# Altium footprint library CUSTOM PCB.PcbLib: 404 footprints (part 7 of 26)
Each footprint in its own frame and in the unit in brackets; x right, y up, seen from the top. Pads: shape width x height; smd on the part's side, far side on the other; paste and mask are expansions set on the pad; w line width, h text height; cw(c..) or ccw(c..) is an arc to the next point about the centre after c.
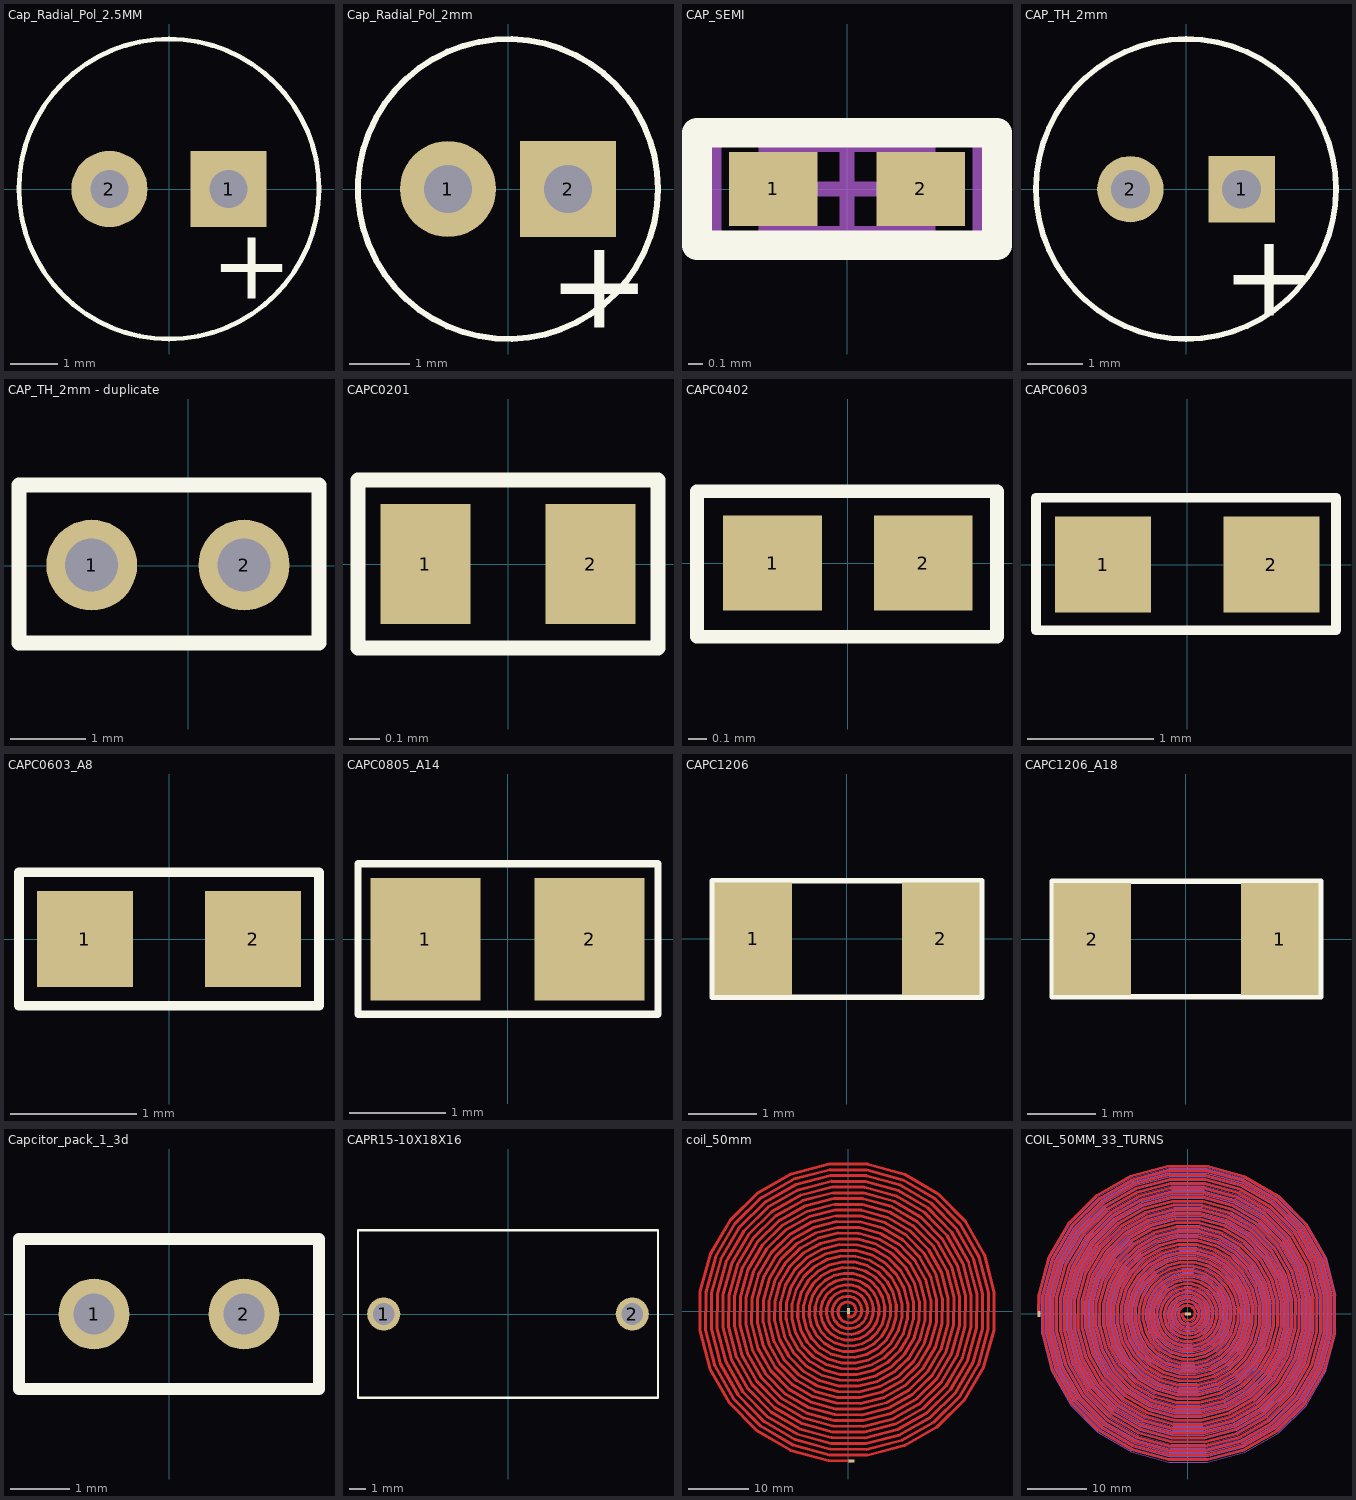
[diagram p6: the footprints below, top view; thin cyan lines are the x and y axes]

## Cap_Radial_Pol_2.5MM [mm]
pads (2):
  rect 1.6x1.6 hole 0.8: 1(1.25,0)
  round 1.6 hole 0.8: 2(-1.25,0)
Top Overlay:
  circle w0.1: c0,0 r3.15
  text "+" at 0.872,-2.307 h1.5
3D body "CapAluRadial_D63H112P25.step": height 11.2, standoff -3, extent -3.184,-3.116 3.117,3.184

## Cap_Radial_Pol_2mm [mm]
pads (2):
  round 1.6 hole 0.8: 1(-1,0)
  rect 1.6x1.6 hole 0.8: 2(1,0)
Top Overlay:
  circle w0.1: c0,0 r2.5
  text "+" at 0.66,-2.311 h1.5
3D body "PCAP_5x11.step": height 11.04, standoff -4.67, extent -2.507,-2.499 2.507,2.499

## CAP_SEMI [mm] "0402_PACK"
pads (2):
  rect 0.6x0.5 smd: 1(-0.5,0) 2(0.5,0)
Top Overlay:
  lines w0.2: -1.016,-0.381 1.016,-0.381 1.016,0.381 -1.016,0.381 -1.016,-0.381
Mechanical 13:
  lines w0.1: -0.55,-0.3 0.55,-0.3 0.55,0.3 -0.55,0.3 -0.55,-0.3
Mechanical 15:
  lines w0.1: -0.3,0 0.3,0 ; 0,-0.3 0,0.3 ; -0.9,-0.35 0.9,-0.35 0.9,0.35 -0.9,0.35 -0.9,-0.35
3D body "SW3dPS-0402 SMD Capacitor.STEP": height 0.12, standoff -0.08, extent -0.5,-0.3 0.5,0.3

## CAP_TH_2mm [mm]
pads (2):
  rect 1.2x1.2 hole 0.7: 1(1.006,0)
  round 1.2 hole 0.7: 2(-1.006,0)
Top Overlay:
  circle w0.1: c0,0.003 r2.713
  text "+" at 0.65,-2.293 h1.5
3D body "User Library-Aluminum Electrolytic Capacitors.STEP": height 13, standoff -0.78, extent -2.709,-2.744 2.792,2.758

## CAP_TH_2mm - duplicate [mm]
pads (2):
  round 1.2 hole 0.7: 1(-1.275,0.01) 2(0.737,0.01)
Top Overlay:
  lines w0.2: -2.235,-1.016 1.727,-1.016 1.727,1.067 -2.235,1.067 -2.235,-1.016
3D body "User Library-Aluminum Electrolytic Capacitors.STEP": height 13, standoff -0.78, extent -2.979,-2.733 2.522,2.769

## CAPC0201 [mm]
pads (2):
  rect 0.3x0.4 smd: 1(-0.275,0) 2(0.275,0)
Top Overlay:
  lines w0.051: -0.5,-0.28 -0.5,0.28 0.5,0.28 0.5,-0.28 -0.5,-0.28
3D body "44025.stp": height 0.15, standoff -0.15, extent -0.3,-0.15 0.3,0.15

## CAPC0402 [mm]
pads (2):
  rect 0.55x0.53 smd: 1(-0.419,0) 2(0.419,0)
Top Overlay:
  lines w0.076: -0.84,-0.41 -0.84,0.4 0.83,0.4 0.83,-0.41 -0.84,-0.41
3D body "User Library-0402 SMD Capacitor.x_t": height 0.2, standoff 0, extent -0.5,-0.3 0.5,0.3

## CAPC0603 [mil]
pads (2):
  rect 30x30 smd: 1(-26.26,0) 2(26.26,0)
Top Overlay:
  lines w3: -47.24,-20.47 46.46,-20.47 46.46,20.87 -47.24,20.87 -47.24,-20.47
3D body "0603 SMD Capacitor.x_t": height 9.13, standoff -2.76, extent -31.5,-15.75 31.5,15.75

## CAPC0603_A8 [mil]
pads (2):
  rect 30x30 smd: 1(-26.26,0) 2(26.26,0)
Top Overlay:
  lines w2.99: -46.85,-20.87 46.85,-20.87 46.85,20.87 -46.85,20.87 -46.85,-20.87
3D body "0603 SMD Capacitor.x_t": height 9.13, standoff -2.76, extent -31.5,-15.75 31.5,15.74

## CAPC0805_A14 [mm]
pads (2):
  rect 1.14x1.27 smd: 1(-0.852,0) 2(0.852,0)
Top Overlay:
  lines w0.076: -1.55,-0.778 -1.55,0.783 1.56,0.783 1.56,-0.778 -1.55,-0.778
3D body "CAPC0805.STEP": height 0.82, standoff -0.08, extent -1.301,-0.678 1.301,0.678
3D body "CAPC0805.STEP": height 0.9, standoff 0, extent -1.301,-0.678 1.301,0.678

## CAPC1206 [mm]
pads (2):
  rect 1.14x1.65 smd: 1(-1.38,0) 2(1.38,0)
Top Overlay:
  lines w0.076: -1.98,-0.86 1.98,-0.86 1.98,0.85 -1.98,0.85 -1.98,-0.86
3D body "User Library-1206 SMD Capacitor.x_t": height 1, standoff 0, extent -1.6,-0.8 1.6,0.8

## CAPC1206_A18 [mm]
pads (2):
  rect 1.14x1.65 smd: 1(1.38,0) 2(-1.38,0)
Top Overlay:
  lines w0.076: -1.97,-0.85 1.98,-0.85 1.98,0.85 -1.97,0.85 -1.97,-0.85
3D body "User Library-1206 SMD Capacitor.x_t": height 1, standoff 0, extent -1.6,-0.8 1.6,0.8

## Capcitor_pack_1_3d [mm]
pads (2):
  round 1.2 hole 0.7: 1(-1.27,0) 2(1.27,0)
Top Overlay:
  lines w0.2: -2.54,-1.27 -2.54,1.27 2.54,1.27 2.54,-1.27 -2.54,-1.27
3D body "Capacitor eletrolitico 100uFx35.STEP": height 11.61, standoff -2.39, extent -2.555,-2.56 2.555,2.54

## CAPR15-10X18X16 [mm]
pads (2):
  round 2 hole 1.3: 1(-7.5,0) 2(7.5,0)
Top Overlay:
  lines w0.15: -9.05,-5.05 -9.05,5.05 9.05,5.05 9.05,-5.05 -9.05,-5.05
Mechanical 15:
  text "1" at -7.5,-0.254 h0.64
  text "2" at 7.5,-0.254 h0.64

## coil_50mm [mm]
pads (2):
  rect 1x0.5 smd: 1(0.508,-24.79)
  rect 0.5x1 smd: 2(0,0)
Top Layer:
  lines w0.5: 0,0 0,-0.488 0,-0.976 0.133,-1.016 0.405,-0.984 0.669,-0.877 0.904,-0.699 1.089,-0.457 1.209,-0.164 1.248,0.159 1.2,0.492 1.062,0.81 0.84,1.089 0.543,1.306 0.19,1.441 -0.196,1.481 -0.589,1.416 -0.961,1.247 -1.284,0.98 -1.533,0.629 -1.684,0.216 -1.724,-0.232 -1.643,-0.686 -1.443,-1.112 -1.131,-1.48 -0.727,-1.759 -0.253,-1.927 0.258,-1.967 0.772,-1.87 1.253,-1.638 1.665,-1.283 1.976,-0.824 2.16,-0.29 2.199,0.284 2.086,0.859 1.823,1.394 1.423,1.85 0.91,2.192 0.316,2.392 -0.321,2.432 -0.956,2.303 -1.545,2.008 -2.045,1.564 -2.419,0.997 -2.635,0.342 -2.675,-0.358 -2.529,-1.053 -2.204,-1.696 -1.715,-2.241 -1.094,-2.646 -0.378,-2.878 0.383,-2.918 1.14,-2.756 1.837,-2.399 2.426,-1.867 2.862,-1.191 3.111,-0.415 3.15,0.409 2.973,1.226 2.584,1.978 2.007,2.611 1.277,3.078 0.441,3.343 -0.446,3.383 -1.323,3.189 -2.129,2.769 -2.806,2.148 -3.305,1.364 -3.586,0.467 -3.626,-0.483 -3.416,-1.42 -2.965,-2.28 -2.299,-3.002 -1.461,-3.532 -0.503,-3.829 0.509,-3.869 1.507,-3.643 2.421,-3.16 3.187,-2.451 3.748,-1.558 4.062,-0.54 4.101,0.535 3.859,1.593 3.345,2.562 2.591,3.372 1.644,3.964 0.566,4.294 -0.571,4.334 -1.69,4.075 -2.713,3.53 -3.567,2.732 -4.191,1.731 -4.537,0.592 -4.577,-0.608 -4.302,-1.787 -3.726,-2.864 -2.883,-3.763 -1.828,-4.418 -0.629,-4.78 0.634,-4.82 1.874,-4.529 3.005,-3.921 3.948,-3.035 4.634,-1.925 5.013,-0.665 5.052,0.66 4.745,1.96 4.106,3.145 3.175,4.133 2.011,4.85 0.691,5.245 -0.696,5.285 -2.057,4.961 -3.297,4.291 -4.328,3.316 -5.077,2.098 -5.488,0.717 -5.528,-0.733 -5.188,-2.154 -4.487,-3.448 -3.467,-4.524 -2.195,-5.304 -0.754,-5.731 0.759,-5.771 2.241,-5.415 3.589,-4.682 4.709,-3.618 5.52,-2.292 5.964,-0.79 6.003,0.785 5.631,2.327 4.867,3.729 3.759,4.894 2.378,5.736 0.816,6.196 -0.822,6.236 -2.424,5.847 -3.881,5.052 -5.089,3.9 -5.963,2.465 -6.439,0.842 -6.479,-0.858 -6.074,-2.521 -5.248,-4.032 -4.051,-5.285 -2.562,-6.19 -0.879,-6.682 0.884,-6.722 2.608,-6.301 4.173,-5.443 5.47,-4.202 6.406,-2.659 6.915,-0.916 6.954,0.91 6.517,2.694 5.628,4.313 4.343,5.655 2.745,6.623 0.942,7.147 -0.947,7.187 -2.791,6.733 -4.465,5.813 -5.85,4.484 -6.85,2.832 -7.39,0.968 -7.43,-0.983 -6.96,-2.888 -6.009,-4.616 -4.635,-6.046 -2.929,-7.076 -1.004,-7.633 1.009,-7.673 2.975,-7.187 4.757,-6.204 6.231,-4.786 7.293,-3.026 7.866,-1.041 7.905,1.035 7.403,3.061 6.389,4.897 4.927,6.416 3.112,7.509 1.067,8.098 -1.072,8.138 -3.158,7.62 -5.049,6.574 -6.611,5.068 -7.736,3.199 -8.341,1.093 -8.381,-1.109 -7.847,-3.255 -6.77,-5.2 -5.219,-6.807 -3.296,-7.963 -1.129,-8.584 1.135,-8.624 3.342,-8.073 5.341,-6.965 6.992,-5.37 8.179,-3.393 8.817,-1.166 8.856,1.161 8.29,3.428 7.15,5.481 5.511,7.176 3.48,8.395 1.192,9.049 -1.197,9.089 -3.525,8.506 -5.632,7.335 -7.372,5.651 -8.622,3.566 -9.292,1.218 -9.332,-1.234 -8.733,-3.623 -7.531,-5.784 -5.803,-7.568 -3.663,-8.849 -1.255,-9.535 1.26,-9.575 3.709,-8.96 5.924,-7.726 7.753,-5.954 9.065,-3.76 9.768,-1.291 9.807,1.286 9.176,3.795 7.911,6.065 6.095,7.937 3.847,9.281 1.317,10 -1.322,10.04 -3.892,9.392 -6.216,8.096 -8.133,6.235 -9.508,3.933 -10.243,1.343 -10.283,-1.359 -9.619,-3.99 -8.292,-6.368 -6.387,-8.329 -4.03,-9.735 -1.38,-10.486 1.385,-10.526 4.076,-9.846 6.508,-8.487 8.514,-6.538 9.951,-4.127 10.719,-1.416 10.758,1.411 10.062,4.162 8.672,6.649 6.679,8.698 4.214,10.167 1.442,10.951 -1.448,10.991 -4.26,10.278 -6.8,8.857 -8.894,6.819 -10.394,4.3 -11.194,1.468 -11.234,-1.484 -10.505,-4.357 -9.053,-6.952 -6.971,-9.09 -4.397,-10.621 -1.505,-11.437 1.51,-11.477 4.443,-10.732 7.092,-9.248 9.275,-7.122 10.837,-4.494 11.67,-1.542 11.709,1.536 10.948,4.529 9.433,7.233 7.263,9.459 4.581,11.054 1.568,11.902 -1.573,11.942 -4.627,11.164 -7.384,9.618 -9.655,7.403 -11.28,4.667 -12.145,1.594 -12.185,-1.609 -11.391,-4.724 -9.814,-7.536 -7.555,-9.851 -4.764,-11.507 -1.63,-12.388 1.635,-12.428 4.81,-11.618 7.676,-10.009 10.035,-7.706 11.723,-4.861 12.62,-1.667 12.66,1.661 11.834,4.897 10.194,7.817 7.846,10.22 4.948,11.94 1.693,12.853 -1.698,12.892 -4.994,12.05 -7.968,10.379 -10.416,7.987 -12.167,5.034 -13.096,1.719 -13.136,-1.735 -12.277,-5.091 -10.575,-8.119 -8.138,-10.612 -5.131,-12.393 -1.755,-13.339 1.761,-13.379 5.177,-12.504 8.26,-10.77 10.796,-8.29 12.61,-5.228 13.571,-1.792 13.611,1.787 12.72,5.264 10.955,8.401 8.43,10.981 5.315,12.826 1.818,13.804 -1.823,13.843 -5.361,12.937 -8.552,11.14 -11.177,8.571 -13.053,5.401 -14.047,1.844 -14.087,-1.86 -13.164,-5.458 -11.335,-8.703 -8.722,-11.373 -5.498,-13.28 -1.881,-14.29 1.886,-14.33 5.544,-13.39 8.844,-11.531 11.557,-8.874 13.496,-5.596 14.522,-1.917 14.562,1.912 13.607,5.631 11.716,8.985 9.014,11.742 5.682,13.712 1.943,14.755 -1.948,14.794 -5.728,13.823 -9.136,11.901 -11.938,9.155 -13.939,5.768 -14.998,1.969 -15.038,-1.985 -14.05,-5.825 -12.096,-9.287 -9.306,-12.134 -5.865,-14.166 -2.006,-15.241 2.011,-15.281 5.911,-14.277 9.428,-12.292 12.318,-9.458 14.382,-5.963 15.473,-2.042 15.513,2.037 14.493,5.998 12.477,9.569 9.598,12.503 6.049,14.598 2.068,15.706 -2.074,15.745 -6.095,14.709 -9.72,12.662 -12.699,9.739 -14.825,6.135 -15.949,2.094 -15.989,-2.11 -14.936,-6.192 -12.857,-9.871 -9.89,-12.894 -6.233,-15.052 -2.131,-16.192 2.136,-16.232 6.278,-15.163 10.012,-13.053 13.079,-10.042 15.268,-6.33 16.424,-2.168 16.464,2.162 15.379,6.365 13.238,10.152 10.182,13.264 6.416,15.484 2.194,16.657 -2.199,16.696 -6.462,15.595 -10.304,13.423 -13.46,10.323 -15.711,6.502 -16.9,2.22 -16.939,-2.235 -15.822,-6.559 -13.618,-10.455 -10.474,-13.655 -6.6,-15.938 -2.256,-17.143 2.261,-17.183 6.645,-16.049 10.596,-13.814 13.84,-10.625 16.154,-6.697 17.375,-2.293 17.415,2.287 16.265,6.732 13.999,10.736 10.766,14.025 6.783,16.371 2.319,17.608 -2.324,17.647 -6.829,16.481 -10.888,14.184 -14.221,10.907 -16.597,6.87 -17.851,2.345 -17.89,-2.361 -16.708,-6.926 -14.379,-11.039 -11.058,-14.416 -6.967,-16.824 -2.381,-18.094 2.387,-18.134 7.013,-16.935 11.18,-14.575 14.601,-11.209 17.041,-7.064 18.326,-2.418 18.366,2.413 17.151,7.099 14.76,11.32 11.35,14.786 7.15,17.257 2.444,18.559 -2.449,18.598 -7.196,17.367 -11.472,14.945 -14.982,11.491 -17.484,7.237 -18.802,2.47 -18.841,-2.486 -17.594,-7.293 -15.14,-11.623 -11.642,-15.177 -7.334,-17.71 -2.507,-19.045 2.512,-19.085 7.38,-17.821 11.764,-15.336 15.362,-11.793 17.927,-7.431 19.277,-2.543 19.317,2.538 18.037,7.466 15.521,11.904 11.934,15.547 7.517,18.143 2.569,19.51 -2.574,19.549 -7.563,18.254 -12.056,15.706 -15.743,12.074 -18.37,7.604 -19.753,2.595 -19.792,-2.611 -18.481,-7.66 -15.901,-12.207 -12.226,-15.938 -7.701,-18.597 -2.632,-19.996 2.637,-20.036 7.747,-18.707 12.347,-16.097 16.123,-12.377 18.813,-7.798 20.228,-2.668 20.268,2.663 18.924,7.833 16.282,12.488 12.518,16.308 7.884,19.029 2.694,20.461 -2.7,20.5 -7.93,19.14 -12.639,16.467 -16.504,12.658 -19.256,7.971 -20.704,2.72 -20.743,-2.736 -19.367,-8.027 -16.662,-12.791 -12.81,-16.699 -8.068,-19.483 -2.757,-20.947 2.762,-20.986 8.114,-19.594 12.931,-16.858 16.884,-12.961 19.699,-8.165 21.179,-2.794 21.219,2.788 19.81,8.2 17.043,13.072 13.102,17.069 8.251,19.915 2.82,21.412 -2.825,21.451 -8.297,20.026 -13.223,17.228 -17.265,13.242 -20.142,8.338 -21.655,2.846 -21.694,-2.861 -20.253,-8.394 -17.423,-13.375 -13.394,-17.46 -8.435,-20.369 -2.882,-21.898 2.887,-21.937 8.481,-20.48 13.515,-17.619 17.645,-13.545 20.585,-8.532 22.13,-2.919 22.17,2.913 20.696,8.567 17.804,13.656 13.686,17.83 8.618,20.801 2.945,22.363 -2.95,22.402 -8.664,20.912 -13.807,17.989 -18.026,13.826 -21.028,8.705 -22.606,2.971 -22.645,-2.987 -21.139,-8.761 -18.184,-13.959 -13.978,-18.221 -8.802,-21.255 -3.007,-22.849 3.013,-22.888 8.848,-21.366 14.099,-18.38 18.406,-14.129 21.471,-8.899 23.081,-3.044 23.121,3.039 21.582,8.934 18.565,14.24 14.27,18.591 8.985,21.688 3.07,23.314 -3.075,23.353 -9.031,21.798 -14.391,18.75 -18.787,14.41 -21.914,9.072 -23.557,3.096 -23.596,-3.112 -22.025,-9.128 -18.945,-14.542 -14.561,-18.982 -9.169,-22.141 -3.133,-23.8 3.138,-23.839 9.215,-22.252 14.683,-19.141 19.167,-14.713 22.358,-9.266 24.032,-3.169 24.072,3.164 22.468,9.301 19.326,14.824 14.853,19.352 9.353,22.574 3.195,24.265 -3.2,24.304 -9.398,22.684 -14.975,19.511 -19.548,14.994 -22.801,9.439 -24.508,3.221 -24.547,-3.237 -22.911,-9.496 -19.706,-15.126 -15.145,-19.743 -9.536,-23.027 -3.258,-24.751 0,-24.79 0.508,-24.79

## COIL_50MM_33_TURNS [mm]
pads (2):
  rect 0.5x1 smd: 1(-24.972,0.002)
  rect 1x0.5 smd: 2(0.032,0.002)
Top Layer:
  lines w0.425: -24.996,0.002 -24.966,3.285 -23.238,9.616 -19.935,15.276 -15.284,19.884 -9.607,23.127 -3.291,24.787 3.231,24.757 9.515,23.042 15.135,19.762 19.708,15.146 22.927,9.51 24.575,3.241 24.544,-3.233 22.842,-9.471 19.586,-15.049 15.004,-19.588 9.41,-22.783 3.187,-24.419 -3.239,-24.388 -9.431,-22.698 -14.967,-19.467 -19.472,-14.918 -22.643,-9.366 -24.266,-3.189 -24.236,3.189 -22.558,9.334 -19.35,14.828 -14.836,19.299 -9.325,22.446 -3.195,24.057 3.135,24.027 9.233,22.361 14.686,19.178 19.124,14.697 22.246,9.228 23.845,3.145 23.814,-3.137 22.161,-9.189 19.002,-14.601 14.555,-19.004 9.128,-22.102 3.091,-23.689 -3.143,-23.658 -9.149,-22.017 -14.518,-18.882 -18.888,-14.47 -21.962,-9.084 -23.536,-3.093 -23.505,3.093 -21.877,9.052 -18.766,14.38 -14.388,18.715 -9.043,21.766 -3.099,23.327 3.039,23.296 8.952,21.681 14.238,18.593 18.539,14.249 21.566,8.946 23.114,3.048 23.084,-3.041 21.481,-8.908 18.417,-14.152 14.107,-18.42 8.846,-21.422 2.995,-22.958 -3.047,-22.928 -8.867,-21.337 -14.07,-18.298 -18.303,-14.021 -21.282,-8.802 -22.806,-2.997 -22.775,2.996 -21.197,8.77 -18.182,13.931 -13.939,18.131 -8.761,21.085 -3.003,22.597 2.943,22.566 8.67,21 13.789,18.009 17.955,13.801 20.885,8.664 22.384,2.952 22.354,-2.945 20.8,-8.626 17.833,-13.704 13.659,-17.835 8.564,-20.742 2.898,-22.228 -2.951,-22.198 -8.585,-20.656 -13.622,-17.714 -17.719,-13.573 -20.601,-8.52 -22.075,-2.901 -22.045,2.9 -20.516,8.488 -17.597,13.483 -13.491,17.546 -8.479,20.405 -2.907,21.866 2.846,21.836 8.388,20.32 13.341,17.425 17.371,13.352 20.205,8.382 21.654,2.856 21.623,-2.849 20.12,-8.344 17.249,-13.255 13.21,-17.251 8.282,-20.061 2.802,-21.498 -2.855,-21.467 -8.303,-19.976 -13.173,-17.129 -17.135,-13.125 -19.921,-8.238 -21.345,-2.805 -21.315,2.804 -19.836,8.206 -17.013,13.035 -13.042,16.962 -8.197,19.724 -2.811,21.136 2.75,21.106 8.106,19.639 12.893,16.84 16.786,12.904 19.524,8.101 20.924,2.76 20.893,-2.753 19.439,-8.062 16.664,-12.807 12.762,-16.667 8,-19.381 2.706,-20.768 -2.758,-20.737 -8.021,-19.295 -12.725,-16.545 -16.55,-12.676 -19.24,-7.956 -20.615,-2.709 -20.584,2.708 -19.155,7.924 -16.429,12.586 -12.594,16.378 -7.916,19.044 -2.714,20.406 2.654,20.375 7.824,18.959 12.444,16.256 16.202,12.455 18.844,7.819 20.193,2.664 20.163,-2.657 18.759,-7.78 16.08,-12.359 12.313,-16.082 7.718,-18.7 2.61,-20.037 -2.662,-20.007 -7.739,-18.615 -12.276,-15.96 -15.966,-12.228 -18.56,-7.674 -19.885,-2.612 -19.854,2.612 -18.475,7.643 -15.844,12.138 -12.146,15.793 -7.634,18.363 -2.618,19.676 2.558,19.645 7.542,18.278 11.996,15.672 15.617,12.007 18.163,7.537 19.463,2.568 19.433,-2.56 18.078,-7.498 15.496,-11.91 11.865,-15.498 7.436,-18.02 2.514,-19.307 -2.566,-19.277 -7.458,-17.935 -11.828,-15.376 -15.382,-11.779 -17.879,-7.392 -19.154,-2.516 -19.124,2.516 -17.794,7.361 -15.26,11.689 -11.697,15.209 -7.352,17.683 -2.522,18.945 2.462,18.915 7.26,17.598 11.547,15.087 15.033,11.559 17.483,7.255 18.733,2.472 18.702,-2.464 17.398,-7.216 14.911,-11.462 11.417,-14.914 7.155,-17.339 2.418,-18.577 -2.47,-18.546 -7.176,-17.254 -11.38,-14.792 -14.797,-11.331 -17.199,-7.111 -18.424,-2.42 -18.394,2.42 -17.114,7.079 -14.676,11.241 -11.249,14.625 -7.07,17.002 -2.426,18.215 2.366,18.185 6.978,16.917 11.099,14.503 14.449,11.11 16.802,6.973 18.003,2.375 17.972,-2.368 16.717,-6.934 14.327,-11.013 10.968,-14.329 6.873,-16.659 2.322,-17.847 -2.374,-17.816 -6.894,-16.574 -10.931,-14.207 -14.213,-10.883 -16.518,-6.829 -17.694,-2.324 -17.663,2.323 -16.433,6.797 -14.091,10.793 -10.8,14.04 -6.788,16.322 -2.33,17.485 2.27,17.454 6.697,16.237 10.651,13.919 13.864,10.662 16.122,6.691 17.272,2.279 17.242,-2.272 16.037,-6.653 13.743,-10.565 10.52,-13.745 6.591,-15.978 2.225,-17.116 -2.278,-17.086 -6.612,-15.893 -10.483,-13.623 -13.629,-10.434 -15.838,-6.547 -16.964,-2.228 -16.933,2.227 -15.753,6.515 -13.507,10.344 -10.352,13.456 -6.506,15.641 -2.234,16.755 2.173,16.724 6.415,15.556 10.202,13.334 13.28,10.213 15.441,6.409 16.542,2.183 16.512,-2.176 15.356,-6.371 13.158,-10.117 10.072,-13.16 6.309,-15.298 2.129,-16.386 -2.182,-16.356 -6.33,-15.213 -10.034,-13.039 -13.044,-9.986 -15.157,-6.265 -16.233,-2.132 -16.203,2.131 -15.072,6.233 -12.923,9.896 -9.904,12.872 -6.224,14.961 -2.138,16.024 2.077,15.994 6.133,14.876 9.754,12.75 12.696,9.765 14.761,6.127 15.812,2.087 15.781,-2.08 14.676,-6.089 12.574,-9.668 9.623,-12.576 6.027,-14.617 2.033,-15.656 -2.086,-15.625 -6.048,-14.532 -9.586,-12.454 -12.46,-9.538 -14.477,-5.983 -15.503,-2.036 -15.473,2.035 -14.392,5.951 -12.338,9.447 -9.455,12.287 -5.943,14.28 -2.041,15.294 1.981,15.264 5.851,14.195 9.306,12.166 12.111,9.317 14.08,5.846 15.082,1.991 15.051,-1.984 13.995,-5.807 11.99,-9.22 9.175,-11.992 5.745,-13.937 1.937,-14.926 -1.989,-14.895 -5.766,-13.852 -9.138,-11.87 -11.876,-9.089 -13.796,-5.701 -14.773,-1.939 -14.742,1.939 -13.711,5.669 -11.754,8.999 -9.007,11.703 -5.661,13.6 -1.945,14.564 1.885,14.533 5.569,13.515 8.857,11.581 11.527,8.868 13.4,5.564 14.351,1.895 14.321,-1.887 13.315,-5.525 11.405,-8.772 8.726,-11.407 5.463,-13.256 1.841,-14.195 -1.893,-14.165 -5.485,-13.171 -8.689,-11.286 -11.291,-8.641 -13.116,-5.419 -14.043,-1.843 -14.012,1.843 -13.031,5.388 -11.169,8.551 -8.559,11.119 -5.379,12.919 -1.849,13.834 1.789,13.803 5.287,12.834 8.409,10.997 10.943,8.42 12.719,5.282 13.621,1.799 13.591,-1.791 12.634,-5.243 10.821,-8.323 8.278,-10.823 5.182,-12.576 1.745,-13.465 -1.797,-13.435 -5.203,-12.491 -8.241,-10.701 -10.707,-8.192 -12.435,-5.138 -13.312,-1.747 -13.282,1.747 -12.35,5.106 -10.585,8.102 -8.11,10.534 -5.097,12.239 -1.753,13.103 1.693,13.073 5.005,12.154 7.96,10.413 10.358,7.972 12.039,5 12.891,1.703 12.86,-1.695 11.954,-4.961 10.237,-7.875 7.83,-10.239 4.9,-11.895 1.649,-12.735 -1.701,-12.704 -4.921,-11.81 -7.793,-10.117 -10.123,-7.744 -11.755,-4.856 -12.582,-1.651 -12.552,1.65 -11.67,4.824 -10.001,7.654 -7.662,9.95 -4.815,11.558 -1.657,12.373 1.597,12.343 4.724,11.473 7.512,9.828 9.774,7.523 11.358,4.718 12.161,1.606 12.13,-1.599 11.273,-4.68 9.652,-7.426 7.381,-9.654 4.618,-11.215 1.552,-12.005 -1.605,-11.974 -4.639,-11.13 -7.344,-9.533 -9.538,-7.296 -11.074,-4.574 -11.852,-1.555 -11.821,1.554 -10.989,4.542 -9.416,7.206 -7.213,9.366 -4.533,10.878 -1.561,11.643 1.5,11.612 4.442,10.793 7.064,9.244 9.19,7.075 10.678,4.436 11.43,1.51 11.4,-1.503 10.593,-4.398 9.068,-6.978 6.933,-9.07 4.336,-10.534 1.456,-11.274 -1.509,-11.244 -4.357,-10.449 -6.896,-8.948 -8.954,-6.847 -10.394,-4.292 -11.122,-1.459 -11.091,1.458 -10.309,4.26 -8.832,6.757 -6.765,8.781 -4.251,10.197 -1.465,10.913 1.404,10.882 4.16,10.112 6.615,8.66 8.605,6.626 9.997,4.154 10.7,1.414 10.67,-1.407 9.912,-4.116 8.484,-6.53 6.484,-8.486 4.054,-9.854 1.36,-10.544 -1.413,-10.514 -4.075,-9.769 -6.447,-8.364 -8.369,-6.399 -9.713,-4.01 -10.391,-1.363 -10.361,1.362 -9.628,3.978 -8.248,6.309 -6.317,8.197 -3.969,9.517 -1.368,10.182 1.308,10.152 3.878,9.432 6.167,8.075 8.021,6.178 9.317,3.873 9.97,1.318 9.939,-1.311 9.232,-3.834 7.899,-6.081 6.036,-7.901 3.772,-9.173 1.264,-9.814 -1.316,-9.783 -3.793,-9.088 -5.999,-7.78 -7.785,-5.95 -9.033,-3.728 -9.661,-1.267 -9.631,1.266 -8.948,3.696 -7.663,5.86 -5.868,7.613 -3.688,8.836 -1.272,9.452 1.212,9.422 3.596,8.751 5.718,7.491 7.437,5.73 8.636,3.591 9.24,1.222 9.209,-1.214 8.551,-3.552 7.315,-5.633 5.588,-7.317 3.49,-8.493 1.168,-9.084 -1.22,-9.053 -3.511,-8.408 -5.551,-7.195 -7.201,-5.502 -8.353,-3.446 -8.931,-1.17 -8.9,1.17 -8.267,3.415 -7.079,5.412 -5.42,7.028 -3.406,8.156 -1.176,8.722 1.116,8.691 3.314,8.071 5.27,6.907 6.852,5.281 7.956,3.309 8.509,1.126 8.479,-1.118 7.871,-3.27 6.731,-5.184 5.139,-6.733 3.209,-7.812 1.072,-8.353 -1.124,-8.323 -3.23,-7.727 -5.102,-6.611 -6.616,-5.054 -7.672,-3.165 -8.201,-1.074 -8.17,1.074 -7.587,3.133 -6.495,4.964 -4.971,6.444 -3.124,7.475 -1.08,7.992 1.02,7.961 3.032,7.39 4.822,6.322 6.268,4.833 7.275,3.027 7.779,1.03 7.749,-1.022 7.19,-2.988 6.146,-4.736 4.691,-6.148 2.927,-7.132 0.976,-7.623 -1.028,-7.593 -2.948,-7.047 -4.654,-6.027 -6.032,-4.605 -6.992,-2.883 -7.47,-0.978 -7.44,0.977 -6.906,2.851 -5.91,4.515 -4.523,5.86 -2.842,6.795 -0.984,7.261 0.924,7.231 2.75,6.71 4.373,5.738 5.684,4.384 6.595,2.745 7.049,0.933 7.018,-0.926 6.51,-2.706 5.562,-4.288 4.243,-5.564 2.645,-6.451 0.88,-6.893 -0.932,-6.862 -2.666,-6.366 -4.205,-5.442 -5.448,-4.157 -6.311,-2.601 -6.74,-0.882 -6.71,0.881 -6.226,2.569 -5.326,4.067 -4.075,5.275 -2.56,6.114 -0.888,6.531 0.827,6.501 2.469,6.029 3.925,5.153 5.099,3.936 5.915,2.463 6.319,0.837 6.288,-0.83 5.829,-2.425 4.978,-3.839 3.794,-4.98 2.363,-5.771 0.783,-6.163 -0.836,-6.132 -2.384,-5.686 -3.757,-4.858 -4.863,-3.709 -5.631,-2.319 -6.01,-0.786 -5.979,0.785 -5.546,2.287 -4.742,3.619 -3.626,4.691 -2.278,5.434 -0.792,5.801 0.731,5.77 2.187,5.349 3.477,4.569 4.515,3.488 5.234,2.181 5.588,0.741 5.558,-0.734 5.149,-2.143 4.393,-3.391 3.346,-4.395 2.081,-5.09 0.687,-5.432 -0.74,-5.402 -2.102,-5.005 -3.309,-4.274 -4.279,-3.26 -4.95,-2.037 -5.28,-0.69 -5.249,0.689 -4.865,2.005 -4.157,3.17 -3.178,4.107 -1.996,4.754 -0.695,5.071 0.635,5.04 1.905,4.668 3.028,3.985 3.931,3.039 4.554,1.899 4.858,0.645 4.828,-0.638 4.468,-1.861 3.809,-2.943 2.897,-3.811 1.799,-4.41 0.591,-4.702 -0.643,-4.672 -1.82,-4.325 -2.86,-3.689 -3.695,-2.812 -4.27,-1.755 -4.549,-0.594 -4.519,0.593 -4.185,1.723 -3.573,2.722 -2.73,3.522 -1.715,4.073 -0.599,4.34 0.539,4.31 1.623,3.988 2.58,3.4 3.346,2.591 3.873,1.618 4.128,0.549 4.097,-0.541 3.788,-1.579 3.224,-2.494 2.449,-3.227 1.517,-3.729 0.495,-3.972 -0.547,-3.941 -1.538,-3.644 -2.412,-3.105 -3.11,-2.363 -3.589,-1.473 -3.819,-0.497 -3.789,0.497 -3.504,1.441 -2.989,2.273 -2.281,2.938 -1.433,3.393 -0.503,3.61 0.443,3.58 1.341,3.307 2.131,2.816 2.762,2.143 3.193,1.336 3.398,0.453 3.367,-0.445 3.108,-1.297 2.64,-2.046 2.001,-2.642 1.235,-3.049 0.399,-3.242 -0.451,-3.211 -1.257,-2.964 -1.964,-2.521 -2.526,-1.915 -2.909,-1.191 -3.089,-0.401 -3.058,0.401 -2.824,1.16 -2.404,1.825 -1.833,2.353 -1.151,2.712 -0.407,2.88 0.347,2.849 1.059,2.627 1.683,2.232 2.178,1.694 2.512,1.054 2.667,0.357 2.637,-0.349 2.427,-1.015 2.056,-1.597 1.552,-2.058 0.954,-2.368 0.303,-2.511 -0.355,-2.481 -0.975,-2.283 -1.515,-1.936 -1.942,-1.467 -2.228,-0.91 -2.359,-0.305 -2.328,0.304 -2.143,0.878 -1.82,1.377 -1.384,1.769 -0.869,2.032 -0.311,2.15 0.251,2.119 0.777,1.947 1.235,1.647 1.593,1.246 1.832,0.772 1.937,0.26 1.907,-0.253 1.747,-0.733 1.471,-1.149 1.104,-1.474 0.672,-1.688 0.207,-1.781 -0.259,-1.751 -0.693,-1.603 -1.067,-1.352 -1.357,-1.018 -1.548,-0.628 -1.628,-0.209 -1.598,0.208 -1.463,0.596 -1.236,0.928 -0.936,1.185 -0.587,1.351 -0.215,1.419 0.154,1.389 0.496,1.266 0.786,1.063 1.009,0.797 1.151,0.49 1.207,0.164 1.176,-0.157 1.066,-0.452 0.887,-0.701 0.655,-0.889 0.39,-1.007 0.11,-1.051 -0.163,-1.02 -0.411,-0.922 -0.618,-0.767 -0.773,-0.57 -0.867,-0.346 -0.898,-0.113 -0.868,0.002 0.032,0.002
Mechanical 1:
  drawing of 2866 lines, arcs and shapes, not listed
3D body: height 0.1, standoff 0, extent -25.145,-24.864 24.868,24.844